# Altium schematic symbol library jlcpcb_2025_04_capacitors_extended_0805.schlib: 3281 symbols (part 7 of 18) (continued)
## C2012X7R1A106KT0A0E
designator C?  Capacitance: 10uF  (hidden comment: *)
Capacitor, Ceramic (MLCC), 10uF, ±10%, 10V, X7R, ±10%, SMD 0805; Manufacturer: TDK; Manufacturer Part Number: C2012X7R1A106KT0A0E; Package Size: 0805; JLCPCB Basic Part: No; JLCPCB Part Number: C342745; Supplier 1: LCSC; Category: Capacitors - MLCC; Supplier Part Number 1: C342745; Tolerance: ±10%; Voltage Rating: 10V; Temperature Coefficient: X7R; RoHS: Yes; ComponentLink1Description: Datasheet; ComponentLink1URL: https://wmsc.lcsc.com/wmsc/upload/file/pdf/v2/lcsc/2304140030_TDK-C2012X7R1A106KT0A0E_C342745.pdf; ComponentLink2Description: JLCPCB Part URL; ComponentLink2URL: https://jlcpcb.com/partdetail/C342745; ComponentLink3Description: LCSC Part URL; ComponentLink3URL: https://lcsc.com/product-detail/Multilayer-Ceramic-Capacitors-MLCC---SMD-SMT_TDK-TDK-C2012X7R1A106KT0A0E_C342745.html
footprint CAP-0805 (0805 (2012M) Capacitor)
pins: 1, 2

## C2012X7R1A475KT0J0E
designator C?  Capacitance: 4.7uF  (hidden comment: *)
Capacitor, Ceramic (MLCC), 4.7uF, ±10%, 10V, X7R, ±10%, SMD 0805; Manufacturer: TDK; Manufacturer Part Number: C2012X7R1A475KT0J0E; Package Size: 0805; JLCPCB Basic Part: No; JLCPCB Part Number: C361188; Supplier 1: LCSC; Category: Capacitors - MLCC; Supplier Part Number 1: C361188; Tolerance: ±10%; Voltage Rating: 10V; Temperature Coefficient: X7R; RoHS: Yes; ComponentLink1Description: Datasheet; ComponentLink1URL: https://wmsc.lcsc.com/wmsc/upload/file/pdf/v2/lcsc/2304140030_TDK-C2012X7R1A475KT0J0E_C361188.pdf; ComponentLink2Description: JLCPCB Part URL; ComponentLink2URL: https://jlcpcb.com/partdetail/C361188; ComponentLink3Description: LCSC Part URL; ComponentLink3URL: https://lcsc.com/product-detail/Multilayer-Ceramic-Capacitors-MLCC---SMD-SMT_TDK-TDK-C2012X7R1A475KT0J0E_C361188.html
footprint CAP-0805 (0805 (2012M) Capacitor)
pins: 1, 2

## C2012X7R1A475KT000N
designator C?  Capacitance: 4.7uF  (hidden comment: *)
Capacitor, Ceramic (MLCC), 4.7uF, ±10%, 10V, X7R, ±10%, SMD 0805; Manufacturer: TDK; Manufacturer Part Number: C2012X7R1A475KT000N; Package Size: 0805; JLCPCB Basic Part: No; JLCPCB Part Number: C76639; Supplier 1: LCSC; Category: Capacitors - MLCC; Supplier Part Number 1: C76639; Tolerance: ±10%; Voltage Rating: 10V; Temperature Coefficient: X7R; RoHS: Yes; ComponentLink1Description: Datasheet; ComponentLink1URL: https://wmsc.lcsc.com/wmsc/upload/file/pdf/v2/lcsc/2304140030_TDK-C2012X7R1A475KT000N_C76639.pdf; ComponentLink2Description: JLCPCB Part URL; ComponentLink2URL: https://jlcpcb.com/partdetail/C76639; ComponentLink3Description: LCSC Part URL; ComponentLink3URL: https://lcsc.com/product-detail/Multilayer-Ceramic-Capacitors-MLCC---SMD-SMT_TDK-TDK-C2012X7R1A475KT000N_C76639.html
footprint CAP-0805 (0805 (2012M) Capacitor)
pins: 1, 2

## C2012X7R1C225KT000N
designator C?  Capacitance: 2.2uF  (hidden comment: *)
Capacitor, Ceramic (MLCC), 2.2uF, ±10%, 16V, X7R, ±10%, SMD 0805; Manufacturer: TDK; Manufacturer Part Number: C2012X7R1C225KT000N; Package Size: 0805; JLCPCB Basic Part: No; JLCPCB Part Number: C338027; Supplier 1: LCSC; Category: Capacitors - MLCC; Supplier Part Number 1: C338027; Tolerance: ±10%; Voltage Rating: 16V; Temperature Coefficient: X7R; RoHS: Yes; ComponentLink1Description: Datasheet; ComponentLink1URL: https://wmsc.lcsc.com/wmsc/upload/file/pdf/v2/lcsc/2304140030_TDK-C2012X7R1C225KT000N_C338027.pdf; ComponentLink2Description: JLCPCB Part URL; ComponentLink2URL: https://jlcpcb.com/partdetail/C338027; ComponentLink3Description: LCSC Part URL; ComponentLink3URL: https://lcsc.com/product-detail/Multilayer-Ceramic-Capacitors-MLCC---SMD-SMT_TDK-TDK-C2012X7R1C225KT000N_C338027.html
footprint CAP-0805 (0805 (2012M) Capacitor)
pins: 1, 2

## C2012X7R1C335KT000N
designator C?  Capacitance: 3.3uF  (hidden comment: *)
Capacitor, Ceramic (MLCC), 3.3uF, ±10%, 16V, X7R, ±10%, SMD 0805; Manufacturer: TDK; Manufacturer Part Number: C2012X7R1C335KT000N; Package Size: 0805; JLCPCB Basic Part: No; JLCPCB Part Number: C342839; Supplier 1: LCSC; Category: Capacitors - MLCC; Supplier Part Number 1: C342839; Tolerance: ±10%; Voltage Rating: 16V; Temperature Coefficient: X7R; RoHS: Yes; ComponentLink1Description: Datasheet; ComponentLink1URL: https://wmsc.lcsc.com/wmsc/upload/file/pdf/v2/lcsc/2304140030_TDK-C2012X7R1C335KT000N_C342839.pdf; ComponentLink2Description: JLCPCB Part URL; ComponentLink2URL: https://jlcpcb.com/partdetail/C342839; ComponentLink3Description: LCSC Part URL; ComponentLink3URL: https://lcsc.com/product-detail/Multilayer-Ceramic-Capacitors-MLCC---SMD-SMT_TDK-TDK-C2012X7R1C335KT000N_C342839.html
footprint CAP-0805 (0805 (2012M) Capacitor)
pins: 1, 2

## C2012X7R1C474KT000N
designator C?  Capacitance: 470nF  (hidden comment: *)
Capacitor, Ceramic (MLCC), 470nF, ±10%, 16V, X7R, ±10%, SMD 0805; Manufacturer: TDK; Manufacturer Part Number: C2012X7R1C474KT000N; Package Size: 0805; JLCPCB Basic Part: No; JLCPCB Part Number: C694187; Supplier 1: LCSC; Category: Capacitors - MLCC; Supplier Part Number 1: C694187; Tolerance: ±10%; Voltage Rating: 16V; Temperature Coefficient: X7R; RoHS: Yes; ComponentLink1Description: Datasheet; ComponentLink1URL: https://wmsc.lcsc.com/wmsc/upload/file/pdf/v2/lcsc/2304140030_TDK-C2012X7R1C474KT000N_C694187.pdf; ComponentLink2Description: JLCPCB Part URL; ComponentLink2URL: https://jlcpcb.com/partdetail/C694187; ComponentLink3Description: LCSC Part URL; ComponentLink3URL: https://lcsc.com/product-detail/Multilayer-Ceramic-Capacitors-MLCC---SMD-SMT_TDK-TDK-C2012X7R1C474KT000N_C694187.html
footprint CAP-0805 (0805 (2012M) Capacitor)
pins: 1, 2

## C2012X7R1C475KTJ00N
designator C?  Capacitance: 4.7uF  (hidden comment: *)
Capacitor, Ceramic (MLCC), 4.7uF, ±10%, 16V, X7R, ±10%, SMD 0805; Manufacturer: TDK; Manufacturer Part Number: C2012X7R1C475KTJ00N; Package Size: 0805; JLCPCB Basic Part: No; JLCPCB Part Number: C342799; Supplier 1: LCSC; Category: Capacitors - MLCC; Supplier Part Number 1: C342799; Tolerance: ±10%; Voltage Rating: 16V; Temperature Coefficient: X7R; RoHS: Yes; ComponentLink1Description: Datasheet; ComponentLink1URL: https://wmsc.lcsc.com/wmsc/upload/file/pdf/v2/lcsc/2304140030_TDK-C2012X7R1C475KTJ00N_C342799.pdf; ComponentLink2Description: JLCPCB Part URL; ComponentLink2URL: https://jlcpcb.com/partdetail/C342799; ComponentLink3Description: LCSC Part URL; ComponentLink3URL: https://lcsc.com/product-detail/Multilayer-Ceramic-Capacitors-MLCC---SMD-SMT_TDK-TDK-C2012X7R1C475KTJ00N_C342799.html
footprint CAP-0805 (0805 (2012M) Capacitor)
pins: 1, 2

## C2012X7R1C684KT000N
designator C?  Capacitance: 680nF  (hidden comment: *)
Capacitor, Ceramic (MLCC), 680nF, ±10%, 16V, X7R, ±10%, SMD 0805; Manufacturer: TDK; Manufacturer Part Number: C2012X7R1C684KT000N; Package Size: 0805; JLCPCB Basic Part: No; JLCPCB Part Number: C694299; Supplier 1: LCSC; Category: Capacitors - MLCC; Supplier Part Number 1: C694299; Tolerance: ±10%; Voltage Rating: 16V; Temperature Coefficient: X7R; RoHS: Yes; ComponentLink1Description: Datasheet; ComponentLink1URL: https://wmsc.lcsc.com/wmsc/upload/file/pdf/v2/lcsc/2304140030_TDK-C2012X7R1C684KT000N_C694299.pdf; ComponentLink2Description: JLCPCB Part URL; ComponentLink2URL: https://jlcpcb.com/partdetail/C694299; ComponentLink3Description: LCSC Part URL; ComponentLink3URL: https://lcsc.com/product-detail/Multilayer-Ceramic-Capacitors-MLCC---SMD-SMT_TDK-TDK-C2012X7R1C684KT000N_C694299.html
footprint CAP-0805 (0805 (2012M) Capacitor)
pins: 1, 2

## C2012X7R1E105KT000N
designator C?  Capacitance: 1uF  (hidden comment: *)
Capacitor, Ceramic (MLCC), 1uF, ±10%, 25V, X7R, ±10%, SMD 0805; Manufacturer: TDK; Manufacturer Part Number: C2012X7R1E105KT000N; Package Size: 0805; JLCPCB Basic Part: No; JLCPCB Part Number: C329927; Supplier 1: LCSC; Category: Capacitors - MLCC; Supplier Part Number 1: C329927; Tolerance: ±10%; Voltage Rating: 25V; Temperature Coefficient: X7R; RoHS: Yes; ComponentLink1Description: Datasheet; ComponentLink1URL: https://wmsc.lcsc.com/wmsc/upload/file/pdf/v2/lcsc/2304140030_TDK-C2012X7R1E105KT000N_C329927.pdf; ComponentLink2Description: JLCPCB Part URL; ComponentLink2URL: https://jlcpcb.com/partdetail/C329927; ComponentLink3Description: LCSC Part URL; ComponentLink3URL: https://lcsc.com/product-detail/Multilayer-Ceramic-Capacitors-MLCC---SMD-SMT_TDK-TDK-C2012X7R1E105KT000N_C329927.html
footprint CAP-0805 (0805 (2012M) Capacitor)
pins: 1, 2

## C2012X7R1E155KT000N
designator C?  Capacitance: 1.5uF  (hidden comment: *)
Capacitor, Ceramic (MLCC), 1.5uF, ±10%, 25V, X7R, ±10%, SMD 0805; Manufacturer: TDK; Manufacturer Part Number: C2012X7R1E155KT000N; Package Size: 0805; JLCPCB Basic Part: No; JLCPCB Part Number: C338028; Supplier 1: LCSC; Category: Capacitors - MLCC; Supplier Part Number 1: C338028; Tolerance: ±10%; Voltage Rating: 25V; Temperature Coefficient: X7R; RoHS: Yes; ComponentLink1Description: Datasheet; ComponentLink1URL: https://wmsc.lcsc.com/wmsc/upload/file/pdf/v2/lcsc/2304140030_TDK-C2012X7R1E155KT000N_C338028.pdf; ComponentLink2Description: JLCPCB Part URL; ComponentLink2URL: https://jlcpcb.com/partdetail/C338028; ComponentLink3Description: LCSC Part URL; ComponentLink3URL: https://lcsc.com/product-detail/Multilayer-Ceramic-Capacitors-MLCC---SMD-SMT_TDK-TDK-C2012X7R1E155KT000N_C338028.html
footprint CAP-0805 (0805 (2012M) Capacitor)
pins: 1, 2

## C2012X7R1E224KT0H0N
designator C?  Capacitance: 220nF  (hidden comment: *)
Capacitor, Ceramic (MLCC), 220nF, ±10%, 25V, X7R, ±10%, SMD 0805; Manufacturer: TDK; Manufacturer Part Number: C2012X7R1E224KT0H0N; Package Size: 0805; JLCPCB Basic Part: No; JLCPCB Part Number: C76640; Supplier 1: LCSC; Category: Capacitors - MLCC; Supplier Part Number 1: C76640; Tolerance: ±10%; Voltage Rating: 25V; Temperature Coefficient: X7R; RoHS: Yes; ComponentLink1Description: Datasheet; ComponentLink1URL: https://wmsc.lcsc.com/wmsc/upload/file/pdf/v2/lcsc/2304140030_TDK-C2012X7R1E224KT0H0N_C76640.pdf; ComponentLink2Description: JLCPCB Part URL; ComponentLink2URL: https://jlcpcb.com/partdetail/C76640; ComponentLink3Description: LCSC Part URL; ComponentLink3URL: https://lcsc.com/product-detail/Multilayer-Ceramic-Capacitors-MLCC---SMD-SMT_TDK-TDK-C2012X7R1E224KT0H0N_C76640.html
footprint CAP-0805 (0805 (2012M) Capacitor)
pins: 1, 2

## C2012X7R1E225KT0J0N
designator C?  Capacitance: 2.2uF  (hidden comment: *)
Capacitor, Ceramic (MLCC), 2.2uF, ±10%, 25V, X7R, ±10%, SMD 0805; Manufacturer: TDK; Manufacturer Part Number: C2012X7R1E225KT0J0N; Package Size: 0805; JLCPCB Basic Part: No; JLCPCB Part Number: C342819; Supplier 1: LCSC; Category: Capacitors - MLCC; Supplier Part Number 1: C342819; Tolerance: ±10%; Voltage Rating: 25V; Temperature Coefficient: X7R; RoHS: Yes; ComponentLink1Description: Datasheet; ComponentLink1URL: https://wmsc.lcsc.com/wmsc/upload/file/pdf/v2/lcsc/2304140030_TDK-C2012X7R1E225KT0J0N_C342819.pdf; ComponentLink2Description: JLCPCB Part URL; ComponentLink2URL: https://jlcpcb.com/partdetail/C342819; ComponentLink3Description: LCSC Part URL; ComponentLink3URL: https://lcsc.com/product-detail/Multilayer-Ceramic-Capacitors-MLCC---SMD-SMT_TDK-TDK-C2012X7R1E225KT0J0N_C342819.html
footprint CAP-0805 (0805 (2012M) Capacitor)
pins: 1, 2

## C2012X7R1E334KT0J0N
designator C?  Capacitance: 330nF  (hidden comment: *)
Capacitor, Ceramic (MLCC), 330nF, ±10%, 25V, X7R, ±10%, SMD 0805; Manufacturer: TDK; Manufacturer Part Number: C2012X7R1E334KT0J0N; Package Size: 0805; JLCPCB Basic Part: No; JLCPCB Part Number: C508856; Supplier 1: LCSC; Category: Capacitors - MLCC; Supplier Part Number 1: C508856; Tolerance: ±10%; Voltage Rating: 25V; Temperature Coefficient: X7R; RoHS: Yes; ComponentLink1Description: Datasheet; ComponentLink1URL: https://wmsc.lcsc.com/wmsc/upload/file/pdf/v2/lcsc/2304140030_TDK-C2012X7R1E334KT0J0N_C508856.pdf; ComponentLink2Description: JLCPCB Part URL; ComponentLink2URL: https://jlcpcb.com/partdetail/C508856; ComponentLink3Description: LCSC Part URL; ComponentLink3URL: https://lcsc.com/product-detail/Multilayer-Ceramic-Capacitors-MLCC---SMD-SMT_TDK-TDK-C2012X7R1E334KT0J0N_C508856.html
footprint CAP-0805 (0805 (2012M) Capacitor)
pins: 1, 2

## C2012X7R1E335KT000N
designator C?  Capacitance: 3.3uF  (hidden comment: *)
Capacitor, Ceramic (MLCC), 3.3uF, ±10%, 25V, X7R, ±10%, SMD 0805; Manufacturer: TDK; Manufacturer Part Number: C2012X7R1E335KT000N; Package Size: 0805; JLCPCB Basic Part: No; JLCPCB Part Number: C342789; Supplier 1: LCSC; Category: Capacitors - MLCC; Supplier Part Number 1: C342789; Tolerance: ±10%; Voltage Rating: 25V; Temperature Coefficient: X7R; RoHS: Yes; ComponentLink1Description: Datasheet; ComponentLink1URL: https://wmsc.lcsc.com/wmsc/upload/file/pdf/v2/lcsc/2304140030_TDK-C2012X7R1E335KT000N_C342789.pdf; ComponentLink2Description: JLCPCB Part URL; ComponentLink2URL: https://jlcpcb.com/partdetail/C342789; ComponentLink3Description: LCSC Part URL; ComponentLink3URL: https://lcsc.com/product-detail/Multilayer-Ceramic-Capacitors-MLCC---SMD-SMT_TDK-TDK-C2012X7R1E335KT000N_C342789.html
footprint CAP-0805 (0805 (2012M) Capacitor)
pins: 1, 2

## C2012X7R1E474KT000N
designator C?  Capacitance: 470nF  (hidden comment: *)
Capacitor, Ceramic (MLCC), 470nF, ±10%, 25V, X7R, ±10%, SMD 0805; Manufacturer: TDK; Manufacturer Part Number: C2012X7R1E474KT000N; Package Size: 0805; JLCPCB Basic Part: No; JLCPCB Part Number: C338008; Supplier 1: LCSC; Category: Capacitors - MLCC; Supplier Part Number 1: C338008; Tolerance: ±10%; Voltage Rating: 25V; Temperature Coefficient: X7R; RoHS: Yes; ComponentLink1Description: Datasheet; ComponentLink1URL: https://wmsc.lcsc.com/wmsc/upload/file/pdf/v2/lcsc/2304140030_TDK-C2012X7R1E474KT000N_C338008.pdf; ComponentLink2Description: JLCPCB Part URL; ComponentLink2URL: https://jlcpcb.com/partdetail/C338008; ComponentLink3Description: LCSC Part URL; ComponentLink3URL: https://lcsc.com/product-detail/Multilayer-Ceramic-Capacitors-MLCC---SMD-SMT_TDK-TDK-C2012X7R1E474KT000N_C338008.html
footprint CAP-0805 (0805 (2012M) Capacitor)
pins: 1, 2

## C2012X7R1E475KT000N
designator C?  Capacitance: 4.7uF  (hidden comment: *)
Capacitor, Ceramic (MLCC), 4.7uF, ±10%, 25V, X7R, ±10%, SMD 0805; Manufacturer: TDK; Manufacturer Part Number: C2012X7R1E475KT000N; Package Size: 0805; JLCPCB Basic Part: No; JLCPCB Part Number: C76642; Supplier 1: LCSC; Category: Capacitors - MLCC; Supplier Part Number 1: C76642; Tolerance: ±10%; Voltage Rating: 25V; Temperature Coefficient: X7R; RoHS: Yes; ComponentLink1Description: Datasheet; ComponentLink1URL: https://wmsc.lcsc.com/wmsc/upload/file/pdf/v2/lcsc/2304140030_TDK-C2012X7R1E475KT000N_C76642.pdf; ComponentLink2Description: JLCPCB Part URL; ComponentLink2URL: https://jlcpcb.com/partdetail/C76642; ComponentLink3Description: LCSC Part URL; ComponentLink3URL: https://lcsc.com/product-detail/Multilayer-Ceramic-Capacitors-MLCC---SMD-SMT_TDK-TDK-C2012X7R1E475KT000N_C76642.html
footprint CAP-0805 (0805 (2012M) Capacitor)
pins: 1, 2

## C2012X7R1E475KT000S
designator C?  Capacitance: 4.7uF  (hidden comment: *)
Capacitor, Ceramic (MLCC), 4.7uF, ±10%, 25V, X7R, ±10%, SMD 0805; Manufacturer: TDK; Manufacturer Part Number: C2012X7R1E475KT000S; Package Size: 0805; JLCPCB Basic Part: No; JLCPCB Part Number: C338100; Supplier 1: LCSC; Category: Capacitors - MLCC; Supplier Part Number 1: C338100; Tolerance: ±10%; Voltage Rating: 25V; Temperature Coefficient: X7R; RoHS: Yes; ComponentLink1Description: Datasheet; ComponentLink1URL: https://wmsc.lcsc.com/wmsc/upload/file/pdf/v2/lcsc/2304140030_TDK-C2012X7R1E475KT000S_C338100.pdf; ComponentLink2Description: JLCPCB Part URL; ComponentLink2URL: https://jlcpcb.com/partdetail/C338100; ComponentLink3Description: LCSC Part URL; ComponentLink3URL: https://lcsc.com/product-detail/Multilayer-Ceramic-Capacitors-MLCC---SMD-SMT_TDK-TDK-C2012X7R1E475KT000S_C338100.html
footprint CAP-0805 (0805 (2012M) Capacitor)
pins: 1, 2

## C2012X7R1E684KT000N
designator C?  Capacitance: 680nF  (hidden comment: *)
Capacitor, Ceramic (MLCC), 680nF, ±10%, 25V, X7R, ±10%, SMD 0805; Manufacturer: TDK; Manufacturer Part Number: C2012X7R1E684KT000N; Package Size: 0805; JLCPCB Basic Part: No; JLCPCB Part Number: C76643; Supplier 1: LCSC; Category: Capacitors - MLCC; Supplier Part Number 1: C76643; Tolerance: ±10%; Voltage Rating: 25V; Temperature Coefficient: X7R; RoHS: Yes; ComponentLink1Description: Datasheet; ComponentLink1URL: https://wmsc.lcsc.com/wmsc/upload/file/pdf/v2/lcsc/2304140030_TDK-C2012X7R1E684KT000N_C76643.pdf; ComponentLink2Description: JLCPCB Part URL; ComponentLink2URL: https://jlcpcb.com/partdetail/C76643; ComponentLink3Description: LCSC Part URL; ComponentLink3URL: https://lcsc.com/product-detail/Multilayer-Ceramic-Capacitors-MLCC---SMD-SMT_TDK-TDK-C2012X7R1E684KT000N_C76643.html
footprint CAP-0805 (0805 (2012M) Capacitor)
pins: 1, 2

## C2012X7R1H103KT000N
designator C?  Capacitance: 10nF  (hidden comment: *)
Capacitor, Ceramic (MLCC), 10nF, ±10%, 50V, X7R, ±10%, SMD 0805; Manufacturer: TDK; Manufacturer Part Number: C2012X7R1H103KT000N; Package Size: 0805; JLCPCB Basic Part: No; JLCPCB Part Number: C694452; Supplier 1: LCSC; Category: Capacitors - MLCC; Supplier Part Number 1: C694452; Tolerance: ±10%; Voltage Rating: 50V; Temperature Coefficient: X7R; RoHS: Yes; ComponentLink1Description: Datasheet; ComponentLink1URL: https://wmsc.lcsc.com/wmsc/upload/file/pdf/v2/lcsc/2304140030_TDK-C2012X7R1H103KT000N_C694452.pdf; ComponentLink2Description: JLCPCB Part URL; ComponentLink2URL: https://jlcpcb.com/partdetail/C694452; ComponentLink3Description: LCSC Part URL; ComponentLink3URL: https://lcsc.com/product-detail/Multilayer-Ceramic-Capacitors-MLCC---SMD-SMT_TDK-TDK-C2012X7R1H103KT000N_C694452.html
footprint CAP-0805 (0805 (2012M) Capacitor)
pins: 1, 2

## C2012X7R1H104KT0J0N
designator C?  Capacitance: 100nF  (hidden comment: *)
Capacitor, Ceramic (MLCC), 100nF, ±10%, 50V, X7R, ±10%, SMD 0805; Manufacturer: TDK; Manufacturer Part Number: C2012X7R1H104KT0J0N; Package Size: 0805; JLCPCB Basic Part: No; JLCPCB Part Number: C76644; Supplier 1: LCSC; Category: Capacitors - MLCC; Supplier Part Number 1: C76644; Tolerance: ±10%; Voltage Rating: 50V; Temperature Coefficient: X7R; RoHS: Yes; ComponentLink1Description: Datasheet; ComponentLink1URL: https://wmsc.lcsc.com/wmsc/upload/file/pdf/v2/lcsc/2304140030_TDK-C2012X7R1H104KT0J0N_C76644.pdf; ComponentLink2Description: JLCPCB Part URL; ComponentLink2URL: https://jlcpcb.com/partdetail/C76644; ComponentLink3Description: LCSC Part URL; ComponentLink3URL: https://lcsc.com/product-detail/Multilayer-Ceramic-Capacitors-MLCC---SMD-SMT_TDK-TDK-C2012X7R1H104KT0J0N_C76644.html
footprint CAP-0805 (0805 (2012M) Capacitor)
pins: 1, 2

## C2012X7R1H104KT000N
designator C?  Capacitance: 100nF  (hidden comment: *)
Capacitor, Ceramic (MLCC), 100nF, ±10%, 50V, X7R, ±10%, SMD 0805; Manufacturer: TDK; Manufacturer Part Number: C2012X7R1H104KT000N; Package Size: 0805; JLCPCB Basic Part: No; JLCPCB Part Number: C136194; Supplier 1: LCSC; Category: Capacitors - MLCC; Supplier Part Number 1: C136194; Tolerance: ±10%; Voltage Rating: 50V; Temperature Coefficient: X7R; RoHS: Yes; ComponentLink1Description: Datasheet; ComponentLink1URL: https://wmsc.lcsc.com/wmsc/upload/file/pdf/v2/lcsc/2304140030_TDK-C2012X7R1H104KT000N_C136194.pdf; ComponentLink2Description: JLCPCB Part URL; ComponentLink2URL: https://jlcpcb.com/partdetail/C136194; ComponentLink3Description: LCSC Part URL; ComponentLink3URL: https://lcsc.com/product-detail/Multilayer-Ceramic-Capacitors-MLCC---SMD-SMT_TDK-TDK-C2012X7R1H104KT000N_C136194.html
footprint CAP-0805 (0805 (2012M) Capacitor)
pins: 1, 2

## C2012X7R1H105KT0J0E
designator C?  Capacitance: 1uF  (hidden comment: *)
Capacitor, Ceramic (MLCC), 1uF, ±10%, 50V, X7R, ±10%, SMD 0805; Manufacturer: TDK; Manufacturer Part Number: C2012X7R1H105KT0J0E; Package Size: 0805; JLCPCB Basic Part: No; JLCPCB Part Number: C880685; Supplier 1: LCSC; Category: Capacitors - MLCC; Supplier Part Number 1: C880685; Tolerance: ±10%; Voltage Rating: 50V; Temperature Coefficient: X7R; RoHS: Yes; ComponentLink1Description: Datasheet; ComponentLink1URL: https://wmsc.lcsc.com/wmsc/upload/file/pdf/v2/lcsc/2304140030_TDK-C2012X7R1H105KT0J0E_C880685.pdf; ComponentLink2Description: JLCPCB Part URL; ComponentLink2URL: https://jlcpcb.com/partdetail/C880685; ComponentLink3Description: LCSC Part URL; ComponentLink3URL: https://lcsc.com/product-detail/Multilayer-Ceramic-Capacitors-MLCC---SMD-SMT_TDK-TDK-C2012X7R1H105KT0J0E_C880685.html
footprint CAP-0805 (0805 (2012M) Capacitor)
pins: 1, 2

## C2012X7R1H105KT000N
designator C?  Capacitance: 1uF  (hidden comment: *)
Capacitor, Ceramic (MLCC), 1uF, ±10%, 50V, X7R, ±10%, SMD 0805; Manufacturer: TDK; Manufacturer Part Number: C2012X7R1H105KT000N; Package Size: 0805; JLCPCB Basic Part: No; JLCPCB Part Number: C76645; Supplier 1: LCSC; Category: Capacitors - MLCC; Supplier Part Number 1: C76645; Tolerance: ±10%; Voltage Rating: 50V; Temperature Coefficient: X7R; RoHS: Yes; ComponentLink1Description: Datasheet; ComponentLink1URL: https://wmsc.lcsc.com/wmsc/upload/file/pdf/v2/lcsc/2304140030_TDK-C2012X7R1H105KT000N_C76645.pdf; ComponentLink2Description: JLCPCB Part URL; ComponentLink2URL: https://jlcpcb.com/partdetail/C76645; ComponentLink3Description: LCSC Part URL; ComponentLink3URL: https://lcsc.com/product-detail/Multilayer-Ceramic-Capacitors-MLCC---SMD-SMT_TDK-TDK-C2012X7R1H105KT000N_C76645.html
footprint CAP-0805 (0805 (2012M) Capacitor)
pins: 1, 2

## C2012X7R1H105KT000S
designator C?  Capacitance: 1uF  (hidden comment: *)
Capacitor, Ceramic (MLCC), 1uF, ±10%, 50V, X7R, ±10%, SMD 0805; Manufacturer: TDK; Manufacturer Part Number: C2012X7R1H105KT000S; Package Size: 0805; JLCPCB Basic Part: No; JLCPCB Part Number: C694453; Supplier 1: LCSC; Category: Capacitors - MLCC; Supplier Part Number 1: C694453; Tolerance: ±10%; Voltage Rating: 50V; Temperature Coefficient: X7R; RoHS: Yes; ComponentLink1Description: Datasheet; ComponentLink1URL: https://wmsc.lcsc.com/wmsc/upload/file/pdf/v2/lcsc/2304140030_TDK-C2012X7R1H105KT000S_C694453.pdf; ComponentLink2Description: JLCPCB Part URL; ComponentLink2URL: https://jlcpcb.com/partdetail/C694453; ComponentLink3Description: LCSC Part URL; ComponentLink3URL: https://lcsc.com/product-detail/Multilayer-Ceramic-Capacitors-MLCC---SMD-SMT_TDK-TDK-C2012X7R1H105KT000S_C694453.html
footprint CAP-0805 (0805 (2012M) Capacitor)
pins: 1, 2

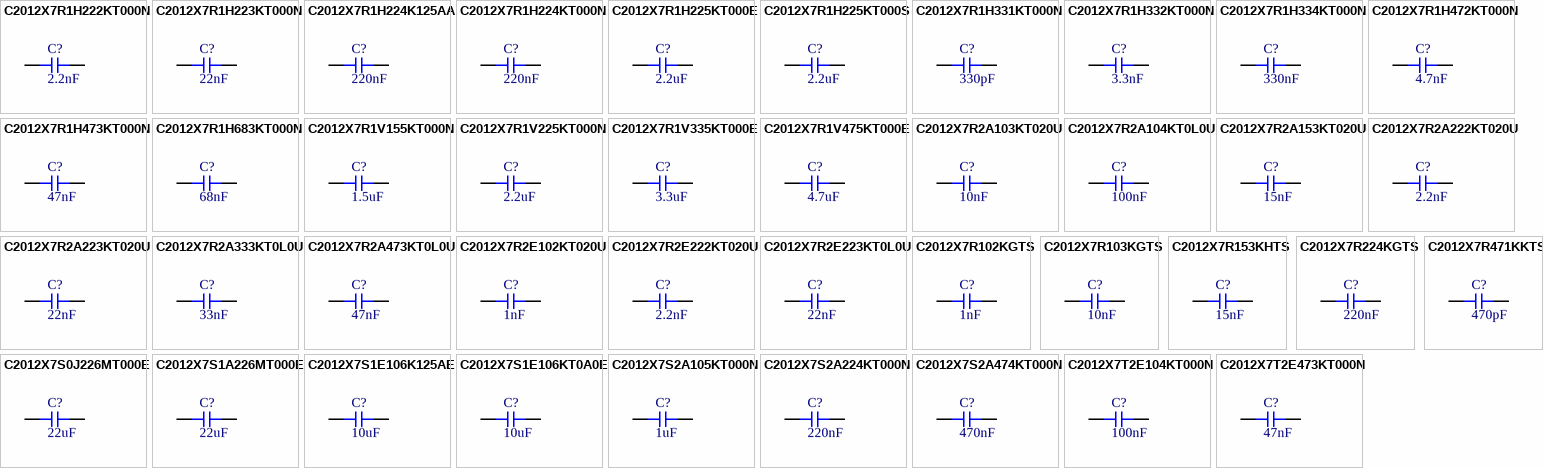
[diagram p29: symbols C2012X7R1H222KT000N to C2012X7T2E473KT000N]

## C2012X7R1H222KT000N
designator C?  Capacitance: 2.2nF  (hidden comment: *)
Capacitor, Ceramic (MLCC), 2.2nF, ±10%, 50V, X7R, ±10%, SMD 0805; Manufacturer: TDK; Manufacturer Part Number: C2012X7R1H222KT000N; Package Size: 0805; JLCPCB Basic Part: No; JLCPCB Part Number: C76647; Supplier 1: LCSC; Category: Capacitors - MLCC; Supplier Part Number 1: C76647; Tolerance: ±10%; Voltage Rating: 50V; Temperature Coefficient: X7R; RoHS: Yes; ComponentLink1Description: Datasheet; ComponentLink1URL: https://wmsc.lcsc.com/wmsc/upload/file/pdf/v2/lcsc/2304140030_TDK-C2012X7R1H222KT000N_C76647.pdf; ComponentLink2Description: JLCPCB Part URL; ComponentLink2URL: https://jlcpcb.com/partdetail/C76647; ComponentLink3Description: LCSC Part URL; ComponentLink3URL: https://lcsc.com/product-detail/Multilayer-Ceramic-Capacitors-MLCC---SMD-SMT_TDK-TDK-C2012X7R1H222KT000N_C76647.html
footprint CAP-0805 (0805 (2012M) Capacitor)
pins: 1, 2

## C2012X7R1H223KT000N
designator C?  Capacitance: 22nF  (hidden comment: *)
Capacitor, Ceramic (MLCC), 22nF, ±10%, 50V, X7R, ±10%, SMD 0805; Manufacturer: TDK; Manufacturer Part Number: C2012X7R1H223KT000N; Package Size: 0805; JLCPCB Basic Part: No; JLCPCB Part Number: C338020; Supplier 1: LCSC; Category: Capacitors - MLCC; Supplier Part Number 1: C338020; Tolerance: ±10%; Voltage Rating: 50V; Temperature Coefficient: X7R; RoHS: Yes; ComponentLink1Description: Datasheet; ComponentLink1URL: https://wmsc.lcsc.com/wmsc/upload/file/pdf/v2/lcsc/2304140030_TDK-C2012X7R1H223KT000N_C338020.pdf; ComponentLink2Description: JLCPCB Part URL; ComponentLink2URL: https://jlcpcb.com/partdetail/C338020; ComponentLink3Description: LCSC Part URL; ComponentLink3URL: https://lcsc.com/product-detail/Multilayer-Ceramic-Capacitors-MLCC---SMD-SMT_TDK-TDK-C2012X7R1H223KT000N_C338020.html
footprint CAP-0805 (0805 (2012M) Capacitor)
pins: 1, 2

## C2012X7R1H224K125AA
designator C?  Capacitance: 220nF  (hidden comment: *)
Capacitor, Ceramic (MLCC), 220nF, ±10%, 50V, X7R, ±10%, SMD 0805; Manufacturer: TDK; Manufacturer Part Number: C2012X7R1H224K125AA; Package Size: 0805; JLCPCB Basic Part: No; JLCPCB Part Number: C2182122; Supplier 1: LCSC; Category: Capacitors - MLCC; Supplier Part Number 1: C2182122; Tolerance: ±10%; Voltage Rating: 50V; Temperature Coefficient: X7R; RoHS: Yes; ComponentLink1Description: Datasheet; ComponentLink1URL: https://wmsc.lcsc.com/wmsc/upload/file/pdf/v2/lcsc/2304140030_TDK-C2012X7R1H224K125AA_C2182122.pdf; ComponentLink2Description: JLCPCB Part URL; ComponentLink2URL: https://jlcpcb.com/partdetail/C2182122; ComponentLink3Description: LCSC Part URL; ComponentLink3URL: https://lcsc.com/product-detail/Multilayer-Ceramic-Capacitors-MLCC---SMD-SMT_TDK-TDK-C2012X7R1H224K125AA_C2182122.html
footprint CAP-0805 (0805 (2012M) Capacitor)
pins: 1, 2

## C2012X7R1H224KT000N
designator C?  Capacitance: 220nF  (hidden comment: *)
Capacitor, Ceramic (MLCC), 220nF, ±10%, 50V, X7R, ±10%, SMD 0805; Manufacturer: TDK; Manufacturer Part Number: C2012X7R1H224KT000N; Package Size: 0805; JLCPCB Basic Part: No; JLCPCB Part Number: C76648; Supplier 1: LCSC; Category: Capacitors - MLCC; Supplier Part Number 1: C76648; Tolerance: ±10%; Voltage Rating: 50V; Temperature Coefficient: X7R; RoHS: Yes; ComponentLink1Description: Datasheet; ComponentLink1URL: https://wmsc.lcsc.com/wmsc/upload/file/pdf/v2/lcsc/2304140030_TDK-C2012X7R1H224KT000N_C76648.pdf; ComponentLink2Description: JLCPCB Part URL; ComponentLink2URL: https://jlcpcb.com/partdetail/C76648; ComponentLink3Description: LCSC Part URL; ComponentLink3URL: https://lcsc.com/product-detail/Multilayer-Ceramic-Capacitors-MLCC---SMD-SMT_TDK-TDK-C2012X7R1H224KT000N_C76648.html
footprint CAP-0805 (0805 (2012M) Capacitor)
pins: 1, 2

## C2012X7R1H225KT000E
designator C?  Capacitance: 2.2uF  (hidden comment: *)
Capacitor, Ceramic (MLCC), 2.2uF, ±10%, 50V, X7R, ±10%, SMD 0805; Manufacturer: TDK; Manufacturer Part Number: C2012X7R1H225KT000E; Package Size: 0805; JLCPCB Basic Part: No; JLCPCB Part Number: C342803; Supplier 1: LCSC; Category: Capacitors - MLCC; Supplier Part Number 1: C342803; Tolerance: ±10%; Voltage Rating: 50V; Temperature Coefficient: X7R; RoHS: Yes; ComponentLink1Description: Datasheet; ComponentLink1URL: https://wmsc.lcsc.com/wmsc/upload/file/pdf/v2/lcsc/2304140030_TDK-C2012X7R1H225KT000E_C342803.pdf; ComponentLink2Description: JLCPCB Part URL; ComponentLink2URL: https://jlcpcb.com/partdetail/C342803; ComponentLink3Description: LCSC Part URL; ComponentLink3URL: https://lcsc.com/product-detail/Multilayer-Ceramic-Capacitors-MLCC---SMD-SMT_TDK-TDK-C2012X7R1H225KT000E_C342803.html
footprint CAP-0805 (0805 (2012M) Capacitor)
pins: 1, 2

## C2012X7R1H225KT000S
designator C?  Capacitance: 2.2uF  (hidden comment: *)
Capacitor, Ceramic (MLCC), 2.2uF, ±10%, 50V, X7R, ±10%, SMD 0805; Manufacturer: TDK; Manufacturer Part Number: C2012X7R1H225KT000S; Package Size: 0805; JLCPCB Basic Part: No; JLCPCB Part Number: C508857; Supplier 1: LCSC; Category: Capacitors - MLCC; Supplier Part Number 1: C508857; Tolerance: ±10%; Voltage Rating: 50V; Temperature Coefficient: X7R; RoHS: Yes; ComponentLink1Description: Datasheet; ComponentLink1URL: https://wmsc.lcsc.com/wmsc/upload/file/pdf/v2/lcsc/2304140030_TDK-C2012X7R1H225KT000S_C508857.pdf; ComponentLink2Description: JLCPCB Part URL; ComponentLink2URL: https://jlcpcb.com/partdetail/C508857; ComponentLink3Description: LCSC Part URL; ComponentLink3URL: https://lcsc.com/product-detail/Multilayer-Ceramic-Capacitors-MLCC---SMD-SMT_TDK-TDK-C2012X7R1H225KT000S_C508857.html
footprint CAP-0805 (0805 (2012M) Capacitor)
pins: 1, 2

## C2012X7R1H331KT000N
designator C?  Capacitance: 330pF  (hidden comment: *)
Capacitor, Ceramic (MLCC), 330pF, ±10%, 50V, X7R, ±10%, SMD 0805; Manufacturer: TDK; Manufacturer Part Number: C2012X7R1H331KT000N; Package Size: 0805; JLCPCB Basic Part: No; JLCPCB Part Number: C694188; Supplier 1: LCSC; Category: Capacitors - MLCC; Supplier Part Number 1: C694188; Tolerance: ±10%; Voltage Rating: 50V; Temperature Coefficient: X7R; RoHS: Yes; ComponentLink1Description: Datasheet; ComponentLink1URL: https://wmsc.lcsc.com/wmsc/upload/file/pdf/v2/lcsc/2304140030_TDK-C2012X7R1H331KT000N_C694188.pdf; ComponentLink2Description: JLCPCB Part URL; ComponentLink2URL: https://jlcpcb.com/partdetail/C694188; ComponentLink3Description: LCSC Part URL; ComponentLink3URL: https://lcsc.com/product-detail/Multilayer-Ceramic-Capacitors-MLCC---SMD-SMT_TDK-TDK-C2012X7R1H331KT000N_C694188.html
footprint CAP-0805 (0805 (2012M) Capacitor)
pins: 1, 2

## C2012X7R1H332KT000N
designator C?  Capacitance: 3.3nF  (hidden comment: *)
Capacitor, Ceramic (MLCC), 3.3nF, ±10%, 50V, X7R, ±10%, SMD 0805; Manufacturer: TDK; Manufacturer Part Number: C2012X7R1H332KT000N; Package Size: 0805; JLCPCB Basic Part: No; JLCPCB Part Number: C338038; Supplier 1: LCSC; Category: Capacitors - MLCC; Supplier Part Number 1: C338038; Tolerance: ±10%; Voltage Rating: 50V; Temperature Coefficient: X7R; RoHS: Yes; ComponentLink1Description: Datasheet; ComponentLink1URL: https://wmsc.lcsc.com/wmsc/upload/file/pdf/v2/lcsc/2304140030_TDK-C2012X7R1H332KT000N_C338038.pdf; ComponentLink2Description: JLCPCB Part URL; ComponentLink2URL: https://jlcpcb.com/partdetail/C338038; ComponentLink3Description: LCSC Part URL; ComponentLink3URL: https://lcsc.com/product-detail/Multilayer-Ceramic-Capacitors-MLCC---SMD-SMT_TDK-TDK-C2012X7R1H332KT000N_C338038.html
footprint CAP-0805 (0805 (2012M) Capacitor)
pins: 1, 2

## C2012X7R1H334KT000N
designator C?  Capacitance: 330nF  (hidden comment: *)
Capacitor, Ceramic (MLCC), 330nF, ±10%, 50V, X7R, ±10%, SMD 0805; Manufacturer: TDK; Manufacturer Part Number: C2012X7R1H334KT000N; Package Size: 0805; JLCPCB Basic Part: No; JLCPCB Part Number: C415297; Supplier 1: LCSC; Category: Capacitors - MLCC; Supplier Part Number 1: C415297; Tolerance: ±10%; Voltage Rating: 50V; Temperature Coefficient: X7R; RoHS: Yes; ComponentLink1Description: Datasheet; ComponentLink1URL: https://wmsc.lcsc.com/wmsc/upload/file/pdf/v2/lcsc/2304140030_TDK-C2012X7R1H334KT000N_C415297.pdf; ComponentLink2Description: JLCPCB Part URL; ComponentLink2URL: https://jlcpcb.com/partdetail/C415297; ComponentLink3Description: LCSC Part URL; ComponentLink3URL: https://lcsc.com/product-detail/Multilayer-Ceramic-Capacitors-MLCC---SMD-SMT_TDK-TDK-C2012X7R1H334KT000N_C415297.html
footprint CAP-0805 (0805 (2012M) Capacitor)
pins: 1, 2

## C2012X7R1H472KT000N
designator C?  Capacitance: 4.7nF  (hidden comment: *)
Capacitor, Ceramic (MLCC), 4.7nF, ±10%, 50V, X7R, ±10%, SMD 0805; Manufacturer: TDK; Manufacturer Part Number: C2012X7R1H472KT000N; Package Size: 0805; JLCPCB Basic Part: No; JLCPCB Part Number: C76650; Supplier 1: LCSC; Category: Capacitors - MLCC; Supplier Part Number 1: C76650; Tolerance: ±10%; Voltage Rating: 50V; Temperature Coefficient: X7R; RoHS: Yes; ComponentLink1Description: Datasheet; ComponentLink1URL: https://wmsc.lcsc.com/wmsc/upload/file/pdf/v2/lcsc/2304140030_TDK-C2012X7R1H472KT000N_C76650.pdf; ComponentLink2Description: JLCPCB Part URL; ComponentLink2URL: https://jlcpcb.com/partdetail/C76650; ComponentLink3Description: LCSC Part URL; ComponentLink3URL: https://lcsc.com/product-detail/Multilayer-Ceramic-Capacitors-MLCC---SMD-SMT_TDK-TDK-C2012X7R1H472KT000N_C76650.html
footprint CAP-0805 (0805 (2012M) Capacitor)
pins: 1, 2

## C2012X7R1H473KT000N
designator C?  Capacitance: 47nF  (hidden comment: *)
Capacitor, Ceramic (MLCC), 47nF, ±10%, 50V, X7R, ±10%, SMD 0805; Manufacturer: TDK; Manufacturer Part Number: C2012X7R1H473KT000N; Package Size: 0805; JLCPCB Basic Part: No; JLCPCB Part Number: C694454; Supplier 1: LCSC; Category: Capacitors - MLCC; Supplier Part Number 1: C694454; Tolerance: ±10%; Voltage Rating: 50V; Temperature Coefficient: X7R; RoHS: Yes; ComponentLink1Description: Datasheet; ComponentLink1URL: https://wmsc.lcsc.com/wmsc/upload/file/pdf/v2/lcsc/2304140030_TDK-C2012X7R1H473KT000N_C694454.pdf; ComponentLink2Description: JLCPCB Part URL; ComponentLink2URL: https://jlcpcb.com/partdetail/C694454; ComponentLink3Description: LCSC Part URL; ComponentLink3URL: https://lcsc.com/product-detail/Multilayer-Ceramic-Capacitors-MLCC---SMD-SMT_TDK-TDK-C2012X7R1H473KT000N_C694454.html
footprint CAP-0805 (0805 (2012M) Capacitor)
pins: 1, 2

## C2012X7R1H683KT000N
designator C?  Capacitance: 68nF  (hidden comment: *)
Capacitor, Ceramic (MLCC), 68nF, ±10%, 50V, X7R, ±10%, SMD 0805; Manufacturer: TDK; Manufacturer Part Number: C2012X7R1H683KT000N; Package Size: 0805; JLCPCB Basic Part: No; JLCPCB Part Number: C338039; Supplier 1: LCSC; Category: Capacitors - MLCC; Supplier Part Number 1: C338039; Tolerance: ±10%; Voltage Rating: 50V; Temperature Coefficient: X7R; RoHS: Yes; ComponentLink1Description: Datasheet; ComponentLink1URL: https://wmsc.lcsc.com/wmsc/upload/file/pdf/v2/lcsc/2304140030_TDK-C2012X7R1H683KT000N_C338039.pdf; ComponentLink2Description: JLCPCB Part URL; ComponentLink2URL: https://jlcpcb.com/partdetail/C338039; ComponentLink3Description: LCSC Part URL; ComponentLink3URL: https://lcsc.com/product-detail/Multilayer-Ceramic-Capacitors-MLCC---SMD-SMT_TDK-TDK-C2012X7R1H683KT000N_C338039.html
footprint CAP-0805 (0805 (2012M) Capacitor)
pins: 1, 2

## C2012X7R1V155KT000N
designator C?  Capacitance: 1.5uF  (hidden comment: *)
Capacitor, Ceramic (MLCC), 1.5uF, ±10%, 35V, X7R, ±10%, SMD 0805; Manufacturer: TDK; Manufacturer Part Number: C2012X7R1V155KT000N; Package Size: 0805; JLCPCB Basic Part: No; JLCPCB Part Number: C338097; Supplier 1: LCSC; Category: Capacitors - MLCC; Supplier Part Number 1: C338097; Tolerance: ±10%; Voltage Rating: 35V; Temperature Coefficient: X7R; RoHS: Yes; ComponentLink1Description: Datasheet; ComponentLink1URL: https://wmsc.lcsc.com/wmsc/upload/file/pdf/v2/lcsc/2304140030_TDK-C2012X7R1V155KT000N_C338097.pdf; ComponentLink2Description: JLCPCB Part URL; ComponentLink2URL: https://jlcpcb.com/partdetail/C338097; ComponentLink3Description: LCSC Part URL; ComponentLink3URL: https://lcsc.com/product-detail/Multilayer-Ceramic-Capacitors-MLCC---SMD-SMT_TDK-TDK-C2012X7R1V155KT000N_C338097.html
footprint CAP-0805 (0805 (2012M) Capacitor)
pins: 1, 2

## C2012X7R1V225KT000N
designator C?  Capacitance: 2.2uF  (hidden comment: *)
Capacitor, Ceramic (MLCC), 2.2uF, ±10%, 35V, X7R, ±10%, SMD 0805; Manufacturer: TDK; Manufacturer Part Number: C2012X7R1V225KT000N; Package Size: 0805; JLCPCB Basic Part: No; JLCPCB Part Number: C342808; Supplier 1: LCSC; Category: Capacitors - MLCC; Supplier Part Number 1: C342808; Tolerance: ±10%; Voltage Rating: 35V; Temperature Coefficient: X7R; RoHS: Yes; ComponentLink1Description: Datasheet; ComponentLink1URL: https://wmsc.lcsc.com/wmsc/upload/file/pdf/v2/lcsc/2101051102_TDK-C2012X7R1V225KT000N_C342808.pdf; ComponentLink2Description: JLCPCB Part URL; ComponentLink2URL: https://jlcpcb.com/partdetail/C342808; ComponentLink3Description: LCSC Part URL; ComponentLink3URL: https://lcsc.com/product-detail/Multilayer-Ceramic-Capacitors-MLCC---SMD-SMT_TDK-TDK-C2012X7R1V225KT000N_C342808.html
footprint CAP-0805 (0805 (2012M) Capacitor)
pins: 1, 2

## C2012X7R1V335KT000E
designator C?  Capacitance: 3.3uF  (hidden comment: *)
Capacitor, Ceramic (MLCC), 3.3uF, ±10%, 35V, X7R, ±10%, SMD 0805; Manufacturer: TDK; Manufacturer Part Number: C2012X7R1V335KT000E; Package Size: 0805; JLCPCB Basic Part: No; JLCPCB Part Number: C361184; Supplier 1: LCSC; Category: Capacitors - MLCC; Supplier Part Number 1: C361184; Tolerance: ±10%; Voltage Rating: 35V; Temperature Coefficient: X7R; RoHS: Yes; ComponentLink1Description: Datasheet; ComponentLink1URL: https://wmsc.lcsc.com/wmsc/upload/file/pdf/v2/lcsc/2304140030_TDK-C2012X7R1V335KT000E_C361184.pdf; ComponentLink2Description: JLCPCB Part URL; ComponentLink2URL: https://jlcpcb.com/partdetail/C361184; ComponentLink3Description: LCSC Part URL; ComponentLink3URL: https://lcsc.com/product-detail/Multilayer-Ceramic-Capacitors-MLCC---SMD-SMT_TDK-TDK-C2012X7R1V335KT000E_C361184.html
footprint CAP-0805 (0805 (2012M) Capacitor)
pins: 1, 2

## C2012X7R1V475KT000E
designator C?  Capacitance: 4.7uF  (hidden comment: *)
Capacitor, Ceramic (MLCC), 4.7uF, ±10%, 35V, X7R, ±10%, SMD 0805; Manufacturer: TDK; Manufacturer Part Number: C2012X7R1V475KT000E; Package Size: 0805; JLCPCB Basic Part: No; JLCPCB Part Number: C76651; Supplier 1: LCSC; Category: Capacitors - MLCC; Supplier Part Number 1: C76651; Tolerance: ±10%; Voltage Rating: 35V; Temperature Coefficient: X7R; RoHS: Yes; ComponentLink1Description: Datasheet; ComponentLink1URL: https://wmsc.lcsc.com/wmsc/upload/file/pdf/v2/lcsc/2304140030_TDK-C2012X7R1V475KT000E_C76651.pdf; ComponentLink2Description: JLCPCB Part URL; ComponentLink2URL: https://jlcpcb.com/partdetail/C76651; ComponentLink3Description: LCSC Part URL; ComponentLink3URL: https://lcsc.com/product-detail/Multilayer-Ceramic-Capacitors-MLCC---SMD-SMT_TDK-TDK-C2012X7R1V475KT000E_C76651.html
footprint CAP-0805 (0805 (2012M) Capacitor)
pins: 1, 2

## C2012X7R2A103KT020U
designator C?  Capacitance: 10nF  (hidden comment: *)
Capacitor, Ceramic (MLCC), 10nF, ±10%, 100V, X7R, ±10%, SMD 0805; Manufacturer: TDK; Manufacturer Part Number: C2012X7R2A103KT020U; Package Size: 0805; JLCPCB Basic Part: No; JLCPCB Part Number: C337996; Supplier 1: LCSC; Category: Capacitors - MLCC; Supplier Part Number 1: C337996; Tolerance: ±10%; Voltage Rating: 100V; Temperature Coefficient: X7R; RoHS: Yes; ComponentLink1Description: Datasheet; ComponentLink1URL: https://wmsc.lcsc.com/wmsc/upload/file/pdf/v2/lcsc/2304140030_TDK-C2012X7R2A103KT020U_C337996.pdf; ComponentLink2Description: JLCPCB Part URL; ComponentLink2URL: https://jlcpcb.com/partdetail/C337996; ComponentLink3Description: LCSC Part URL; ComponentLink3URL: https://lcsc.com/product-detail/Multilayer-Ceramic-Capacitors-MLCC---SMD-SMT_TDK-TDK-C2012X7R2A103KT020U_C337996.html
footprint CAP-0805 (0805 (2012M) Capacitor)
pins: 1, 2

## C2012X7R2A104KT0L0U
designator C?  Capacitance: 100nF  (hidden comment: *)
Capacitor, Ceramic (MLCC), 100nF, ±10%, 100V, X7R, ±10%, SMD 0805; Manufacturer: TDK; Manufacturer Part Number: C2012X7R2A104KT0L0U; Package Size: 0805; JLCPCB Basic Part: No; JLCPCB Part Number: C76652; Supplier 1: LCSC; Category: Capacitors - MLCC; Supplier Part Number 1: C76652; Tolerance: ±10%; Voltage Rating: 100V; Temperature Coefficient: X7R; RoHS: Yes; ComponentLink1Description: Datasheet; ComponentLink1URL: https://wmsc.lcsc.com/wmsc/upload/file/pdf/v2/lcsc/2304140030_TDK-C2012X7R2A104KT0L0U_C76652.pdf; ComponentLink2Description: JLCPCB Part URL; ComponentLink2URL: https://jlcpcb.com/partdetail/C76652; ComponentLink3Description: LCSC Part URL; ComponentLink3URL: https://lcsc.com/product-detail/Multilayer-Ceramic-Capacitors-MLCC---SMD-SMT_TDK-TDK-C2012X7R2A104KT0L0U_C76652.html
footprint CAP-0805 (0805 (2012M) Capacitor)
pins: 1, 2

## C2012X7R2A153KT020U
designator C?  Capacitance: 15nF  (hidden comment: *)
Capacitor, Ceramic (MLCC), 15nF, ±10%, 100V, X7R, ±10%, SMD 0805; Manufacturer: TDK; Manufacturer Part Number: C2012X7R2A153KT020U; Package Size: 0805; JLCPCB Basic Part: No; JLCPCB Part Number: C338022; Supplier 1: LCSC; Category: Capacitors - MLCC; Supplier Part Number 1: C338022; Tolerance: ±10%; Voltage Rating: 100V; Temperature Coefficient: X7R; RoHS: Yes; ComponentLink1Description: Datasheet; ComponentLink1URL: https://wmsc.lcsc.com/wmsc/upload/file/pdf/v2/lcsc/2304140030_TDK-C2012X7R2A153KT020U_C338022.pdf; ComponentLink2Description: JLCPCB Part URL; ComponentLink2URL: https://jlcpcb.com/partdetail/C338022; ComponentLink3Description: LCSC Part URL; ComponentLink3URL: https://lcsc.com/product-detail/Multilayer-Ceramic-Capacitors-MLCC---SMD-SMT_TDK-TDK-C2012X7R2A153KT020U_C338022.html
footprint CAP-0805 (0805 (2012M) Capacitor)
pins: 1, 2

## C2012X7R2A222KT020U
designator C?  Capacitance: 2.2nF  (hidden comment: *)
Capacitor, Ceramic (MLCC), 2.2nF, ±10%, 100V, X7R, ±10%, SMD 0805; Manufacturer: TDK; Manufacturer Part Number: C2012X7R2A222KT020U; Package Size: 0805; JLCPCB Basic Part: No; JLCPCB Part Number: C415299; Supplier 1: LCSC; Category: Capacitors - MLCC; Supplier Part Number 1: C415299; Tolerance: ±10%; Voltage Rating: 100V; Temperature Coefficient: X7R; RoHS: Yes; ComponentLink1Description: Datasheet; ComponentLink1URL: https://wmsc.lcsc.com/wmsc/upload/file/pdf/v2/lcsc/2304140030_TDK-C2012X7R2A222KT020U_C415299.pdf; ComponentLink2Description: JLCPCB Part URL; ComponentLink2URL: https://jlcpcb.com/partdetail/C415299; ComponentLink3Description: LCSC Part URL; ComponentLink3URL: https://lcsc.com/product-detail/Multilayer-Ceramic-Capacitors-MLCC---SMD-SMT_TDK-TDK-C2012X7R2A222KT020U_C415299.html
footprint CAP-0805 (0805 (2012M) Capacitor)
pins: 1, 2

## C2012X7R2A223KT020U
designator C?  Capacitance: 22nF  (hidden comment: *)
Capacitor, Ceramic (MLCC), 22nF, ±10%, 100V, X7R, ±10%, SMD 0805; Manufacturer: TDK; Manufacturer Part Number: C2012X7R2A223KT020U; Package Size: 0805; JLCPCB Basic Part: No; JLCPCB Part Number: C694457; Supplier 1: LCSC; Category: Capacitors - MLCC; Supplier Part Number 1: C694457; Tolerance: ±10%; Voltage Rating: 100V; Temperature Coefficient: X7R; RoHS: Yes; ComponentLink1Description: Datasheet; ComponentLink1URL: https://wmsc.lcsc.com/wmsc/upload/file/pdf/v2/lcsc/2304140030_TDK-C2012X7R2A223KT020U_C694457.pdf; ComponentLink2Description: JLCPCB Part URL; ComponentLink2URL: https://jlcpcb.com/partdetail/C694457; ComponentLink3Description: LCSC Part URL; ComponentLink3URL: https://lcsc.com/product-detail/Multilayer-Ceramic-Capacitors-MLCC---SMD-SMT_TDK-TDK-C2012X7R2A223KT020U_C694457.html
footprint CAP-0805 (0805 (2012M) Capacitor)
pins: 1, 2

## C2012X7R2A333KT0L0U
designator C?  Capacitance: 33nF  (hidden comment: *)
Capacitor, Ceramic (MLCC), 33nF, ±10%, 100V, X7R, ±10%, SMD 0805; Manufacturer: TDK; Manufacturer Part Number: C2012X7R2A333KT0L0U; Package Size: 0805; JLCPCB Basic Part: No; JLCPCB Part Number: C337997; Supplier 1: LCSC; Category: Capacitors - MLCC; Supplier Part Number 1: C337997; Tolerance: ±10%; Voltage Rating: 100V; Temperature Coefficient: X7R; RoHS: Yes; ComponentLink1Description: Datasheet; ComponentLink1URL: https://wmsc.lcsc.com/wmsc/upload/file/pdf/v2/lcsc/2304140030_TDK-C2012X7R2A333KT0L0U_C337997.pdf; ComponentLink2Description: JLCPCB Part URL; ComponentLink2URL: https://jlcpcb.com/partdetail/C337997; ComponentLink3Description: LCSC Part URL; ComponentLink3URL: https://lcsc.com/product-detail/Multilayer-Ceramic-Capacitors-MLCC---SMD-SMT_TDK-TDK-C2012X7R2A333KT0L0U_C337997.html
footprint CAP-0805 (0805 (2012M) Capacitor)
pins: 1, 2

## C2012X7R2A473KT0L0U
designator C?  Capacitance: 47nF  (hidden comment: *)
Capacitor, Ceramic (MLCC), 47nF, ±10%, 100V, X7R, ±10%, SMD 0805; Manufacturer: TDK; Manufacturer Part Number: C2012X7R2A473KT0L0U; Package Size: 0805; JLCPCB Basic Part: No; JLCPCB Part Number: C342507; Supplier 1: LCSC; Category: Capacitors - MLCC; Supplier Part Number 1: C342507; Tolerance: ±10%; Voltage Rating: 100V; Temperature Coefficient: X7R; RoHS: Yes; ComponentLink1Description: Datasheet; ComponentLink1URL: https://wmsc.lcsc.com/wmsc/upload/file/pdf/v2/lcsc/2304140030_TDK-C2012X7R2A473KT0L0U_C342507.pdf; ComponentLink2Description: JLCPCB Part URL; ComponentLink2URL: https://jlcpcb.com/partdetail/C342507; ComponentLink3Description: LCSC Part URL; ComponentLink3URL: https://lcsc.com/product-detail/Multilayer-Ceramic-Capacitors-MLCC---SMD-SMT_TDK-TDK-C2012X7R2A473KT0L0U_C342507.html
footprint CAP-0805 (0805 (2012M) Capacitor)
pins: 1, 2

## C2012X7R2E102KT020U
designator C?  Capacitance: 1nF  (hidden comment: *)
Capacitor, Ceramic (MLCC), 1nF, ±10%, 250V, X7R, ±10%, SMD 0805; Manufacturer: TDK; Manufacturer Part Number: C2012X7R2E102KT020U; Package Size: 0805; JLCPCB Basic Part: No; JLCPCB Part Number: C343026; Supplier 1: LCSC; Category: Capacitors - MLCC; Supplier Part Number 1: C343026; Tolerance: ±10%; Voltage Rating: 250V; Temperature Coefficient: X7R; RoHS: Yes; ComponentLink1Description: Datasheet; ComponentLink1URL: https://wmsc.lcsc.com/wmsc/upload/file/pdf/v2/lcsc/2304140030_TDK-C2012X7R2E102KT020U_C343026.pdf; ComponentLink2Description: JLCPCB Part URL; ComponentLink2URL: https://jlcpcb.com/partdetail/C343026; ComponentLink3Description: LCSC Part URL; ComponentLink3URL: https://lcsc.com/product-detail/Multilayer-Ceramic-Capacitors-MLCC---SMD-SMT_TDK-TDK-C2012X7R2E102KT020U_C343026.html
footprint CAP-0805 (0805 (2012M) Capacitor)
pins: 1, 2
